# Altium footprint library SMT.PcbLib: 151 footprints (part 8 of 10)
Each footprint in its own frame and in the unit in brackets; x right, y up, seen from the top. Pads: shape width x height; smd on the part's side, far side on the other; paste and mask are expansions set on the pad; w line width, h text height; cw(c..) or ccw(c..) is an arc to the next point about the centre after c.
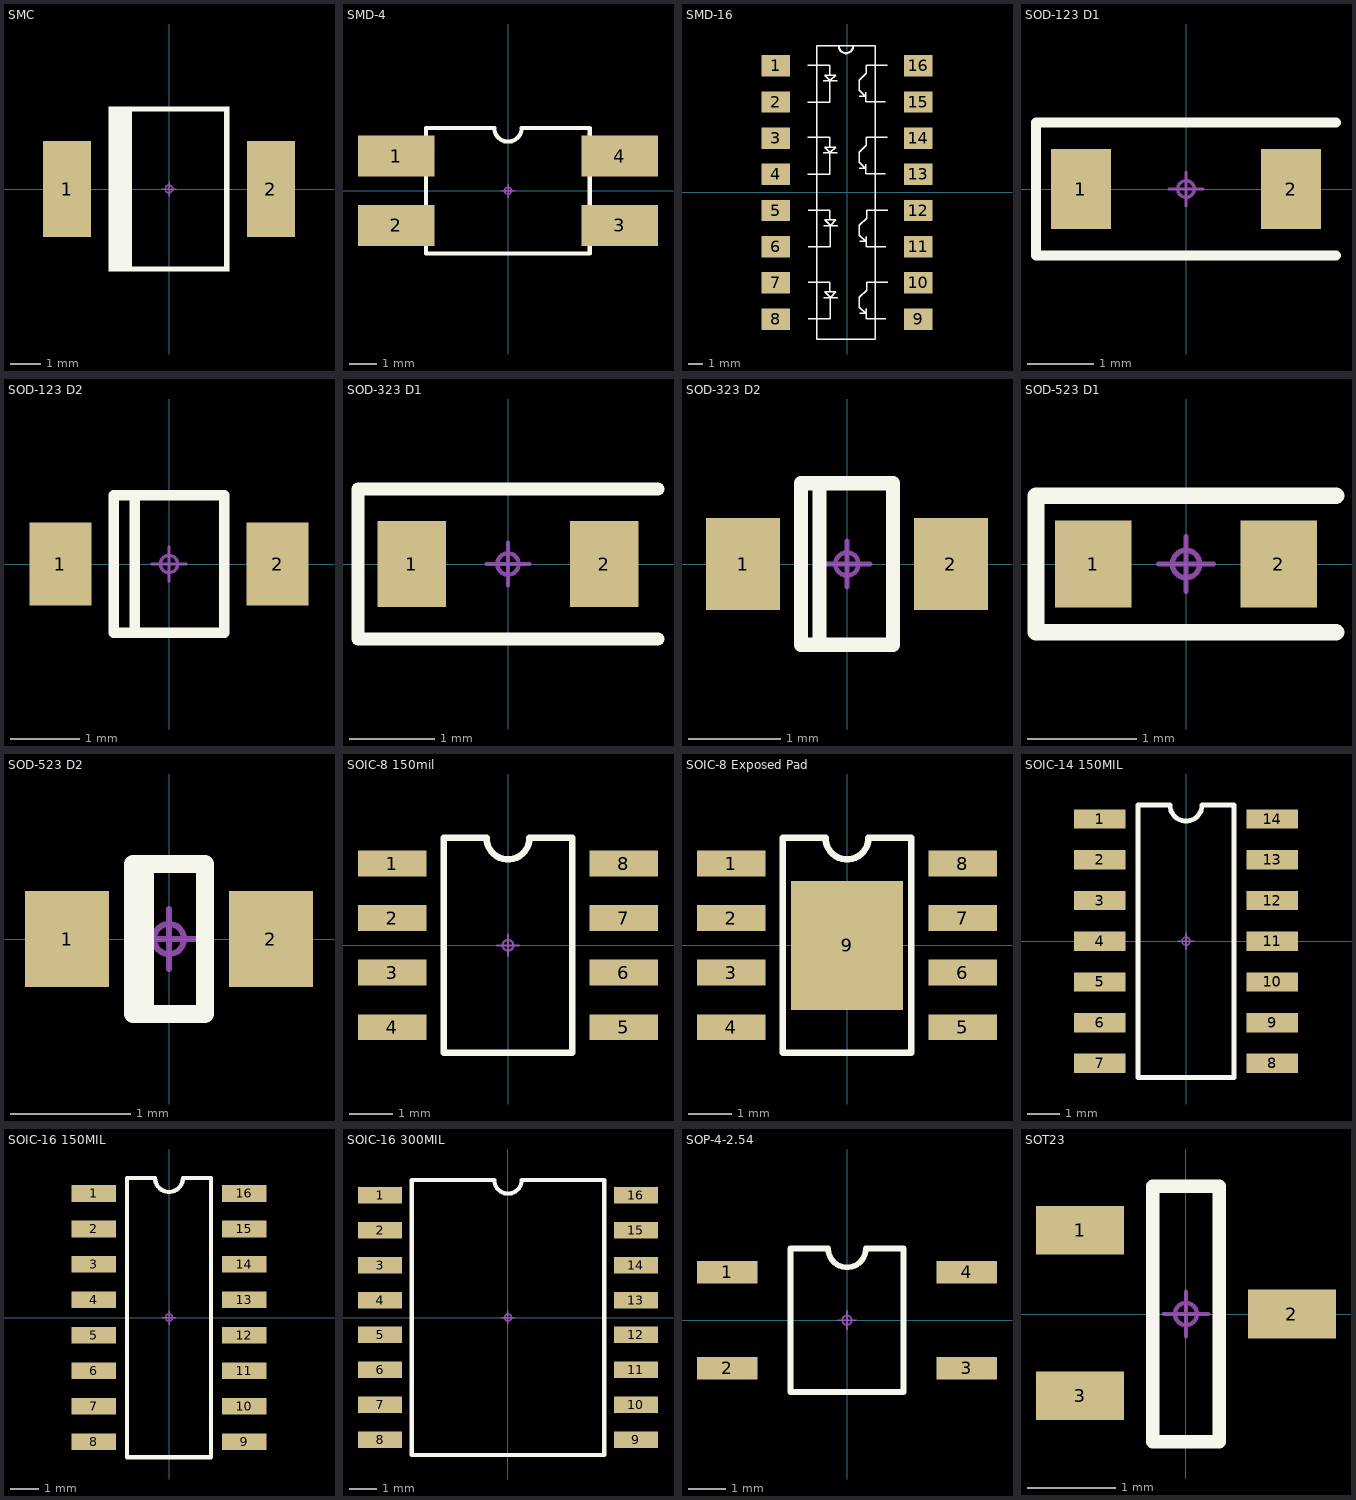
[diagram p7: the footprints below, top view; thin cyan lines are the x and y axes]

## SMC [mm]
pads (2):
  rect 1.6x3.2 smd paste-0.1: 1(-3.4,0) 2(3.4,0)
Top Overlay:
  region: -2,2.75 -1.25,2.75 -1.25,-2.75 -2,-2.75
  region: 1.85,2.75 2,2.75 2,-2.75 1.85,-2.75
  region: -1.625,-2.75 1.85,-2.75 1.85,-2.6 -1.625,-2.6
  region: -1.625,2.75 1.85,2.75 1.85,2.6 -1.625,2.6
Mechanical 15:
  circle w0.05: c0,0 r0.125
  lines w0.05: -0.25,0 0.25,0 ; 0,-0.25 0,0.25
3D body "smc_do-214ab.stp": height 2, standoff 0, extent -3.557,-2.795 3.557,2.795

## SMD-4 [mm]
pads (4):
  rect 2.8x1.5 smd: 1(-4.1,1.27) 2(-4.1,-1.27) 3(4.1,-1.27) 4(4.1,1.27)
Top Overlay:
  lines w0.152: -3.005,-2.3 -3.005,2.3 -0.5,2.3 ccw(c0,2.3) 0.5,2.3 2.995,2.3 2.995,-2.3 -3.005,-2.3
Mechanical 15:
  circle w0.05: c0,0 r0.125
  lines w0.05: -0.25,0 0.25,0 ; 0,-0.25 0,0.25
3D body "pc817.stp": height 3.7, standoff 0, extent -4.82,-2.29 4.8,2.29
3D body "p230-150.stp": height 0.02, standoff 0, extent -5.461,-2.02 -3.161,-0.52
3D body "p230-150.stp": height 0.02, standoff 0, extent -5.461,0.52 -3.161,2.02
3D body "p230-150.stp": height 0.02, standoff 0, extent 3.168,0.52 5.468,2.02
3D body "p230-150.stp": height 0.02, standoff 0, extent 3.168,-2.02 5.468,-0.52

## SMD-16 [mm]
pads (16):
  rect 2x1.5 smd: 1(-5,8.89) 2(-5,6.35) 3(-5,3.81) 4(-5,1.27) 5(-5,-1.27) 6(-5,-3.81) 7(-5,-6.35) 8(-5,-8.89) 9(5,-8.89) 10(5,-6.35) 11(5,-3.81) 12(5,-1.27) 13(5,1.27) 14(5,3.81) 15(5,6.35) 16(5,8.89)
Top Overlay:
  lines w0.1: -2.75,1.285 -1.2,1.285 -1.2,2.81 ; -2.75,3.86 -1.225,3.86 -1.225,3.21 ; -2.75,6.34 -1.2,6.34 -1.2,7.865 ; -2.75,8.915 -1.225,8.915 -1.225,8.265 ; -2.725,-8.875 -1.175,-8.875 -1.175,-7.35 ; -2.725,-6.3 -1.2,-6.3 -1.2,-6.95 ; -2.725,-3.82 -1.175,-3.82 -1.175,-2.295 ; -2.725,-1.245 -1.2,-1.245 -1.2,-1.895 ; -1.65,2.785 -0.675,2.785 ; -1.65,7.84 -0.675,7.84 ; -1.625,-7.375 -0.65,-7.375 ; -1.625,-2.32 -0.65,-2.32 ; 0.875,1.685 1.275,1.685 ; 0.875,6.74 1.275,6.74 ; 0.9,-8.475 1.3,-8.475 ; 0.9,-3.42 1.3,-3.42 ; 1.3,1.985 1.325,1.96 1.325,1.685 ; 1.3,7.04 1.325,7.015 1.325,6.74 ; 1.325,-8.175 1.35,-8.2 1.35,-8.475 ; 1.325,-3.12 1.35,-3.145 1.35,-3.42 ; 2.7,1.31 1.325,1.31 1.325,1.685 ; 2.7,6.365 1.325,6.365 1.325,6.74 ; 2.725,-8.85 1.35,-8.85 1.35,-8.475 ; 2.725,-3.795 1.35,-3.795 1.35,-3.42 ; 2.825,3.86 1.35,3.86 1.35,3.31 0.85,2.81 0.85,2.11 1.275,1.685 ; 2.825,8.915 1.35,8.915 1.35,8.365 0.85,7.865 0.85,7.165 1.275,6.74 ; 2.85,-6.3 1.375,-6.3 1.375,-6.85 0.875,-7.35 0.875,-8.05 1.3,-8.475 ; 2.85,-1.245 1.375,-1.245 1.375,-1.795 0.875,-2.295 0.875,-2.995 1.3,-3.42 ; -1.2,2.81 -1.575,3.185 -0.8,3.185 -1.175,2.81 -1.2,2.81 ; -1.2,7.865 -1.175,7.865 -0.8,8.24 -1.575,8.24 -1.2,7.865 ; -1.175,-7.35 -1.55,-6.975 -0.775,-6.975 -1.15,-7.35 -1.175,-7.35 ; -1.175,-2.295 -1.55,-1.92 -0.775,-1.92 -1.15,-2.295 -1.175,-2.295 ; 1.275,1.685 1.325,1.685 ; 1.275,6.74 1.325,6.74 ; 1.3,-8.475 1.35,-8.475 ; 1.3,-3.42 1.35,-3.42 ; -2.125,-10.287 -2.125,9.89 -2.125,10.29 1.975,10.29 1.975,-10.287 -2.125,-10.287
  lines w0.152: -0.575,10.275 ccw(c-0.075,10.275) 0.425,10.275
Mechanical 18:
  text "12" at 14.573,2.124 h0.5
  text "11" at 14.573,3.394 h0.5
  text "3" at 19.773,-0.216 h0.5
  text "5" at 19.773,2.324 h0.5
  text "2" at 19.773,-1.486 h0.5
  text "6" at 19.773,3.594 h0.5
  text "4" at 19.773,1.054 h0.5
  text "1" at 19.773,-2.756 h0.5
  text "15" at 14.573,-1.686 h0.5
  text "16" at 14.573,-2.956 h0.5
  text "9" at 14.573,6.134 h0.5
  text "7" at 19.773,4.864 h0.5
  text "10" at 14.573,4.664 h0.5
  text "8" at 19.773,6.134 h0.5
  text "13" at 14.573,0.854 h0.5
  text "14" at 14.573,-0.416 h0.5
3D body "tlp521-4.stp": height 4.6, standoff 0.13, extent -5.23,-10.16 5.23,10.16
3D body "p200-150.stp": height 0.01, standoff 0, extent 3.988,8.14 5.988,9.64
3D body "p200-150.stp": height 0.01, standoff 0, extent 4.013,5.575 6.013,7.075
3D body "p200-150.stp": height 0.01, standoff 0, extent 3.988,3.035 5.988,4.535
3D body "p200-150.stp": height 0.01, standoff 0, extent 3.988,0.495 5.988,1.995
3D body "p200-150.stp": height 0.01, standoff 0, extent 3.988,-2.02 5.988,-0.52
3D body "p200-150.stp": height 0.01, standoff 0, extent 4.013,-4.56 6.013,-3.06
3D body "p200-150.stp": height 0.01, standoff 0, extent 3.988,-7.151 5.988,-5.651
3D body "p200-150.stp": height 0.01, standoff 0, extent 4,-9.64 6,-8.14
3D body "p200-150.stp": height 0.01, standoff 0, extent -6.013,-9.64 -4.013,-8.14
3D body "p200-150.stp": height 0.01, standoff 0, extent -6.013,-7.1 -4.013,-5.6
3D body "p200-150.stp": height 0.01, standoff 0, extent -5.988,-4.535 -3.988,-3.035
3D body "p200-150.stp": height 0.01, standoff 0, extent -5.988,-2.02 -3.988,-0.52
3D body "p200-150.stp": height 0.01, standoff 0, extent -6.013,0.545 -4.013,2.045
3D body "p200-150.stp": height 0.01, standoff 0, extent -5.988,3.009 -3.988,4.509
3D body "p200-150.stp": height 0.01, standoff 0, extent -5.988,5.6 -3.988,7.1
3D body "p200-150.stp": height 0.01, standoff 0, extent -6.013,8.14 -4.013,9.64

## SOD-123 D1 [mm]
pads (2):
  rect 0.9x1.2 smd paste-0.02: 1(-1.575,0) 2(1.575,0)
Top Overlay:
  lines w0.152: 2.25,-1 -2.25,-1 -2.25,1 2.25,1
Mechanical 15:
  circle w0.05: c0,0 r0.125
  lines w0.05: -0.25,0 0.25,0 ; 0,-0.25 0,0.25
3D body "SOD-123.stp": height 1.35, standoff 0, extent -1.803,-0.9 2.061,0.9

## SOD-123 D2 [mm]
pads (2):
  rect 0.9x1.2 smd paste-0.02: 1(-1.575,0) 2(1.575,0)
Top Overlay:
  lines w0.152: -0.5,-1 -0.5,1 ; -0.8,-1 -0.8,1 0.8,1 0.8,-1 -0.8,-1
Mechanical 15:
  circle w0.05: c0,0 r0.125
  lines w0.05: -0.25,0 0.25,0 ; 0,-0.25 0,0.25
3D body "SOD-123.stp": height 1.35, standoff 0, extent -1.803,-0.9 2.061,0.9

## SOD-323 D1 [mm]
pads (2):
  rect 0.8x1 smd paste-0.02: 1(-1.125,0) 2(1.125,0)
Top Overlay:
  lines w0.152: 1.75,-0.875 -1.75,-0.875 -1.75,0.875 1.75,0.875
Mechanical 15:
  circle w0.05: c0,0 r0.125
  lines w0.05: -0.25,0 0.25,0 ; 0,-0.25 0,0.25
3D body "SOD-323.STEP": height 1, standoff 0, extent -1.175,-0.65 1.425,0.65

## SOD-323 D2 [mm]
pads (2):
  rect 0.8x1 smd paste-0.02: 1(-1.125,0) 2(1.125,0)
Top Overlay:
  lines w0.152: -0.3,-0.875 -0.3,0.875 ; -0.5,-0.875 0.5,-0.875 0.5,0.875 -0.5,0.875 -0.5,-0.875
Mechanical 15:
  circle w0.05: c0,0 r0.125
  lines w0.05: -0.25,0 0.25,0 ; 0,-0.25 0,0.25
3D body "SOD-323.STEP": height 1, standoff 0, extent -1.175,-0.65 1.425,0.65

## SOD-523 D1 [mm]
pads (2):
  rect 0.7x0.8 smd paste-0.02: 1(-0.85,0) 2(0.85,0)
Top Overlay:
  lines w0.152: 1.375,-0.625 -1.375,-0.625 -1.375,0.625 1.375,0.625
Mechanical 15:
  circle w0.05: c0,0 r0.125
  lines w0.05: -0.25,0 0.25,0 ; 0,-0.25 0,0.25
3D body "User Library-SOD-523F.STEP": height 0.7, standoff 0, extent -0.65,-0.399 0.95,0.399

## SOD-523 D2 [mm]
pads (2):
  rect 0.7x0.8 smd paste-0.02: 1(-0.85,0) 2(0.85,0)
Top Overlay:
  lines w0.152: -0.2,-0.625 -0.2,0.625 ; -0.3,-0.625 0.3,-0.625 0.3,0.625 -0.3,0.625 -0.3,-0.625
Mechanical 15:
  circle w0.05: c0,0 r0.125
  lines w0.05: -0.25,0 0.25,0 ; 0,-0.25 0,0.25
3D body "User Library-SOD-523F.STEP": height 0.7, standoff 0, extent -0.65,-0.399 0.95,0.399

## SOIC-8 150mil [mm]
pads (8):
  rect 1.6x0.6 smd paste-0.02: 1(-2.692,1.905) 2(-2.692,0.635) 3(-2.692,-0.635) 4(-2.692,-1.905) 5(2.692,-1.905) 6(2.692,-0.635) 7(2.692,0.635) 8(2.692,1.905)
Top Overlay:
  lines w0.152: -1.5,-2.5 -1.5,2.5 -0.5,2.5 ccw(c0,2.5) 0.5,2.5 1.5,2.5 1.5,-2.5 -1.5,-2.5
Mechanical 15:
  circle w0.05: c0,0 r0.125
  lines w0.05: -0.25,0 0.25,0 ; 0,-0.25 0,0.25
3D body "User Library-sop-8.STEP": height 1.6, standoff 0, extent -3.021,-2.51 3.021,2.51

## SOIC-8 Exposed Pad [mm]
pads (9):
  rect 1.6x0.6 smd paste-0.02: 1(-2.692,1.905) 2(-2.692,0.635) 3(-2.692,-0.635) 4(-2.692,-1.905) 5(2.692,-1.905) 6(2.692,-0.635) 7(2.692,0.635) 8(2.692,1.905)
  rect 2.6x3 smd paste-0.2: 9(0,0)
Top Overlay:
  lines w0.152: -1.5,-2.5 -1.5,2.5 -0.5,2.5 ccw(c0,2.5) 0.5,2.5 1.5,2.5 1.5,-2.5 -1.5,-2.5
Mechanical 15:
  circle w0.05: c0,0 r0.125
  lines w0.05: -0.25,0 0.25,0 ; 0,-0.25 0,0.25
3D body "User Library-sop-8.STEP": height 1.6, standoff 0, extent -3.021,-2.51 3.021,2.51

## SOIC-14 150MIL [mm]
pads (14):
  rect 1.6x0.6 smd paste-0.02: 1(-2.692,3.81) 2(-2.692,2.54) 3(-2.692,1.27) 4(-2.692,0) 5(-2.692,-1.27) 6(-2.692,-2.54) 7(-2.692,-3.81) 8(2.692,-3.81) 9(2.692,-2.54) 10(2.692,-1.27) 11(2.692,0) 12(2.692,1.27) 13(2.692,2.54) 14(2.692,3.81)
Top Overlay:
  lines w0.152: -1.5,-4.25 -1.5,4.25 -0.5,4.25 ccw(c0,4.25) 0.5,4.25 1.5,4.25 1.5,-4.25 -1.5,-4.25
Mechanical 15:
  circle w0.05: c0,0 r0.125
  lines w0.05: -0.25,0 0.25,0 ; 0,-0.25 0,0.25
3D body "SOIC14.STEP": height 1.75, standoff 0, extent -2.9,-4.255 2.9,4.275

## SOIC-16 150MIL [mm]
pads (16):
  rect 1.6x0.6 smd paste-0.02: 1(-2.692,4.445) 2(-2.692,3.175) 3(-2.692,1.905) 4(-2.692,0.635) 5(-2.692,-0.635) 6(-2.692,-1.905) 7(-2.692,-3.175) 8(-2.692,-4.445) 9(2.692,-4.445) 10(2.692,-3.175) 11(2.692,-1.905) 12(2.692,-0.635) 13(2.692,0.635) 14(2.692,1.905) 15(2.692,3.175) 16(2.692,4.445)
Top Overlay:
  lines w0.152: -1.5,-5 -1.5,5 -0.5,5 ccw(c0,5) 0.5,5 1.5,5 1.5,-5 -1.5,-5
Mechanical 15:
  circle w0.05: c0,0 r0.125
  lines w0.05: -0.25,0 0.25,0 ; 0,-0.25 0,0.25
3D body "User Library-SOIC-16-1.STEP": height 1.4, standoff 0, extent -3,-4.95 3,4.95

## SOIC-16 300MIL [mm]
pads (16):
  rect 1.6x0.6 smd: 1(-4.65,4.445) 2(-4.65,3.175) 3(-4.65,1.905) 4(-4.65,0.635) 5(-4.65,-0.635) 6(-4.65,-1.905) 7(-4.65,-3.175) 8(-4.65,-4.445) 9(4.65,-4.445) 10(4.65,-3.175) 11(4.65,-1.905) 12(4.65,-0.635) 13(4.65,0.635) 14(4.65,1.905) 15(4.65,3.175) 16(4.65,4.445)
Top Overlay:
  lines w0.152: -3.5,-5 -3.5,5 -0.5,5 ccw(c0,5) 0.5,5 3.5,5 3.5,-5 -3.5,-5
Mechanical 15:
  circle w0.05: c0,0 r0.125
  lines w0.05: -0.25,0 0.25,0 ; 0,-0.25 0,0.25
3D body "User Library-SOIC16-300.STEP": height 2.65, standoff 0, extent -5.132,-5.144 5.168,5.156

## SOP-4-2.54 [mm]
height 12.8
pads (4):
  rect 1.6x0.6 smd: 1(-3.175,1.27) 2(-3.175,-1.27) 3(3.175,-1.27) 4(3.175,1.27)
Top Overlay:
  lines w0.152: -1.5,-1.9 1.5,-1.9 1.5,1.9 0.5,1.9 cw(c0,1.9) -0.5,1.9 -1.5,1.9 -1.5,-1.9
Mechanical 15:
  circle w0.05: c0,0 r0.125
  lines w0.05: -0.25,0 0.25,0 ; 0,-0.25 0,0.25
3D body "el357n.stp": height 2, standoff 0, extent -3.7,-2.05 3.7,2.05

## SOT23 [mm]
pads (3):
  rect 1x0.55 smd paste-0.02: 1(-1.2,0.95) 2(1.2,0) 3(-1.2,-0.925)
Top Overlay:
  lines w0.152: -0.375,-1.45 0.375,-1.45 0.375,1.45 -0.375,1.45 -0.375,-1.45
Mechanical 15:
  circle w0.05: c0,0 r0.125
  lines w0.05: -0.25,0 0.25,0 ; 0,-0.25 0,0.25
3D body "SW3dPS-sot-3p290x130ll237h100.STEP": height 1, standoff 0, extent -1.16,-1.45 1.21,1.45